# Altium footprint library dcdc_ldo_ref.pcblib: 50 footprints (part 2 of 4)
Each footprint in its own frame and in the unit in brackets; x right, y up, seen from the top. Pads: shape width x height; smd on the part's side, far side on the other; paste and mask are expansions set on the pad; w line width, h text height; cw(c..) or ccw(c..) is an arc to the next point about the centre after c.
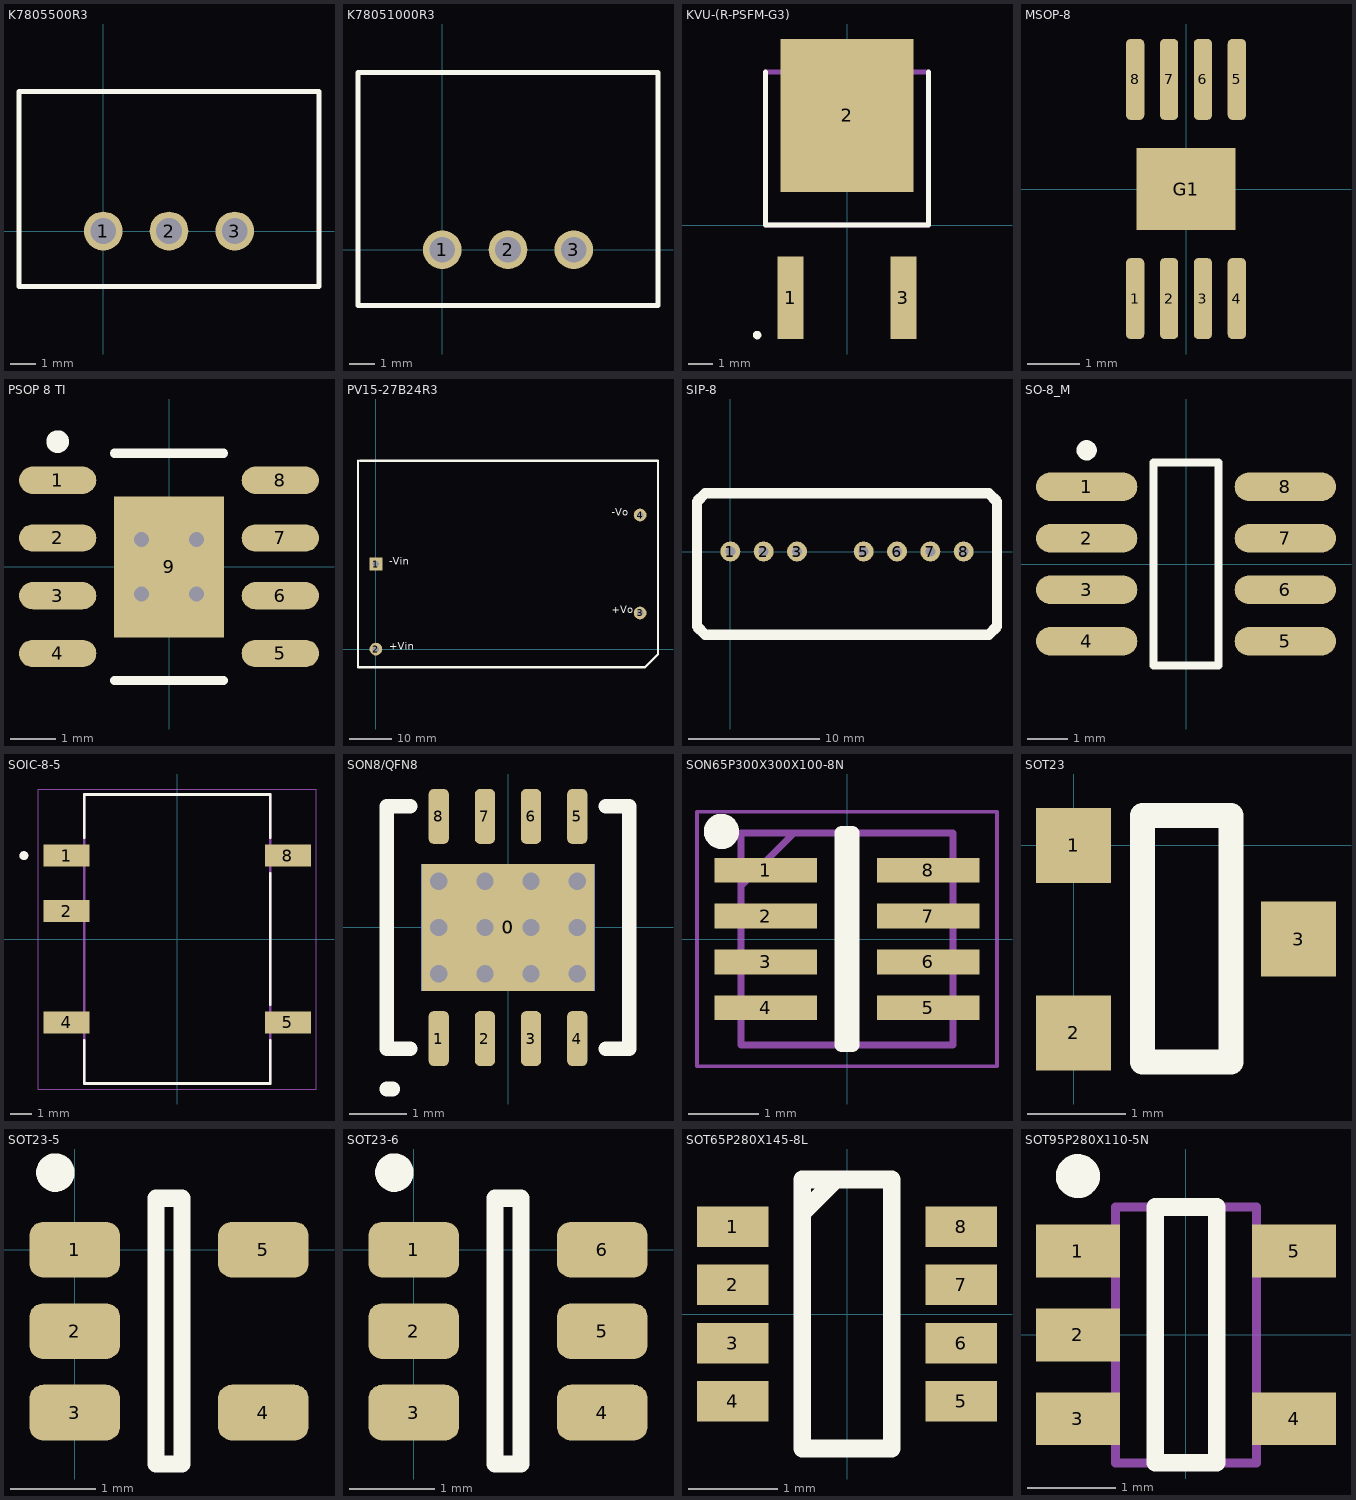
[diagram p1: the footprints below, top view; thin cyan lines are the x and y axes]

## K7805500R3 [mm]
pads (3):
  round 1.5 hole 1: 1(0,0) 2(2.54,0) 3(5.08,0)
Top Overlay:
  lines w0.2: -3.26,-2.15 8.34,-2.15 8.34,5.4 -3.26,5.4 -3.26,-2.15
3D body "K7805-500R3.stp": height 10.51, standoff -5, extent -3.26,-2.15 8.34,5.4

## K78051000R3 [mm]
pads (3):
  round 1.5 hole 1: 1(0,0) 2(2.54,0) 3(5.08,0)
Top Overlay:
  lines w0.2: -3.26,-2.15 -3.26,6.85 8.34,6.85 8.34,-2.15 -3.26,-2.15
3D body "K78xx-1000R3.stp": height 17.5, standoff -4.1, extent -3.2,-2.15 8.3,6.85

## KVU-(R-PSFM-G3) [mm]
pads (3):
  rect 1.07x3.34 smd: 1(-2.29,-2.947) 3(2.29,-2.947)
  rect 5.4x6.2 smd: 2(0,4.453)
Top Overlay:
  circle w0.2: c-3.647,-4.457 r0.072
  lines w0.2: -3.3,6.22 -3.3,0 3.3,0 3.3,6.22
Plata3D:
  lines w0.2: -3.3,0 -3.3,6.22 3.3,6.22 3.3,0 -3.3,0
3D body "UA78M12CKVURG3.stp": height 2.43, standoff 0, extent -3.193,-3.588 3.333,6.518

## MSOP-8 [mm]
pads (9):
  rrect50% 0.35x1.55 smd: 1(-0.975,-2.1) 2(-0.325,-2.1) 3(0.325,-2.1) 4(0.975,-2.1) 5(0.975,2.1) 6(0.325,2.1) 7(-0.325,2.1) 8(-0.975,2.1)
  rect 1.89x1.57 smd: G1(0,0)
3D body "MSOP-8.step": height 1.09, standoff -0.01, extent -1.5,-2.5 1.5,2.5

## PSOP 8 TI [mm]
pads (9):
  oval 1.7x0.6 smd: 1(-2.45,1.905) 2(-2.45,0.635) 3(-2.45,-0.635) 4(-2.45,-1.905) 5(2.45,-1.905) 6(2.45,-0.635) 7(2.45,0.635) 8(2.45,1.905)
  rect 2.41x3.1 smd: 9(0,0)
via -0.6,-0.6 diameter 0.66 hole 0.33
via 0.6,-0.6 diameter 0.66 hole 0.33
via 0.6,0.6 diameter 0.66 hole 0.33
via -0.6,0.6 diameter 0.66 hole 0.33
Top Overlay:
  circle w0.25: c-2.45,2.755 r0.125
  lines w0.2: -1.2,-2.5 1.2,-2.5 ; -1.2,2.5 1.2,2.5
3D body "User Library-SO8-1.step": height 1.7, standoff -0.05, extent -3.1,-2.5 3.1,2.5

## PV15-27B24R3 [mm] "DC-DC thr"
pads (4):
  rect 3x3 hole 1.5: 1(0,20)
  round 3 hole 1.5: 2(0,0) 3(62.09,8.5) 4(62.09,31.5)
Top Overlay:
  lines w0.5: -4.205,44.25 -4.205,-4.25 63.25,-4.25 66.295,-1.205 66.295,44.25 -3.705,44.25
  text "-Vo" at 55.429,30.808 h3
  text "+Vo" at 55.429,7.808 h3
  text "+Vin" at 3.105,-0.762 h3
  text "-Vin" at 3.105,19.238 h3
3D body "PV15-27BxxR3.stp": height 23.6, standoff 0.1, extent -4,-4 66,44

## SIP-8 [mil]
pads (7):
  round 60 hole 30: 1(0,0) 2(100,0) 3(200,0) 5(400,0) 6(500,0) 7(600,0) 8(700,0)
Top Overlay:
  lines w31.5: -100,-225 -75,-250 775,-250 800,-225 800,150 775,175 -75,175 -100,150 -100,0 -100,-225
3D body "User Library-User Library-TRACO TMR rev3.step": height 389.76, standoff -149.61, extent -79.13,-218.12 779.13,152

## SO-8_M [mm] "SOIC, 8-Leads, Body 4.9x3.9mm, Pitch 1.27mm, IPC Low Density"
height 1.75
pads (8):
  oval 2.5x0.7 smd: 1(-2.45,1.905) 2(-2.45,0.635) 3(-2.45,-0.635) 4(-2.45,-1.905) 5(2.45,-1.905) 6(2.45,-0.635) 7(2.45,0.635) 8(2.45,1.905)
Top Overlay:
  circle w0.25: c-2.45,2.805 r0.125
  lines w0.2: -0.8,-2.5 0.8,-2.5 0.8,2.5 -0.8,2.5 -0.8,-2.5
3D body "so-8.step": height 1.88, standoff -0.03, extent -3.169,-2.515 3.169,2.489

## SOIC-8-5 [mm]
pads (5):
  rect 2.1x1 smd: 1(-5.05,3.81) 2(-5.05,1.27) 4(-5.05,-3.81) 5(5.05,-3.81) 8(5.05,3.81)
Top Overlay:
  circle w0.2: c-7,3.81 r0.1
  lines w0.127: -4.25,-4.63 -4.25,-6.6 4.25,-6.6 4.25,-4.63 ; -4.25,4.63 -4.25,6.6 4.25,6.6 4.25,4.63 ; 4.25,-2.99 4.25,2.99
Plata3D:
  circle w0.2: c-7,3.81 r0.1
  lines w0.127: -4.25,-6.6 -4.25,6.6 4.25,6.6 4.25,-6.6 -4.25,-6.6
Board3D:
  lines w0.05: -6.35,-6.85 6.35,-6.85 6.35,6.85 -6.35,6.85 -6.35,-6.85
3D body "step_temp.STEP": height 7.25, standoff 0, extent -5.7,-6.6 5.7,6.6

## SON8/QFN8 [mm] "SON8/QFN8"
pads (10):
  rect 3x2.2 smd mask+0.07: 0(0,0)
  rect 3x2.2 smd far side mask+0.07: 0(0,0)
  rrect50% 0.35x0.95 smd mask+0.07: 1(-1.2,-1.925) 2(-0.4,-1.925) 3(0.4,-1.925) 4(1.2,-1.925) 5(1.2,1.925) 6(0.4,1.925) 7(-0.4,1.925) 8(-1.2,1.925)
via -0.4,0 diameter 0.5 hole 0.3
via 0.4,0 diameter 0.5 hole 0.3
via -1.2,0 diameter 0.5 hole 0.3
via 1.2,0 diameter 0.5 hole 0.3
via 1.2,-0.8 diameter 0.5 hole 0.3
via -1.2,-0.8 diameter 0.5 hole 0.3
via 0.4,-0.8 diameter 0.5 hole 0.3
via -0.4,-0.8 diameter 0.5 hole 0.3
via 1.2,0.8 diameter 0.5 hole 0.3
via -1.2,0.8 diameter 0.5 hole 0.3
via 0.4,0.8 diameter 0.5 hole 0.3
via -0.4,0.8 diameter 0.5 hole 0.3
Top Overlay:
  lines w0.254: -2.1,-2.8 -2,-2.8 ; -1.7,-2.1 -2.1,-2.1 -2.1,2.1 -1.7,2.1 ; 1.7,-2.1 2.1,-2.1 2.1,2.1 1.7,2.1
3D body "User Library-SON8-4x4mm.step": height 0.85, standoff 0, extent -2,-2.05 2,1.95

## SON65P300X300X100-8N [mm]
pads (8):
  rect 1.45x0.35 smd: 1(-1.15,0.975) 2(-1.15,0.325) 3(-1.15,-0.325) 4(-1.15,-0.975) 5(1.15,-0.975) 6(1.15,-0.325) 7(1.15,0.325) 8(1.15,0.975)
Top Overlay:
  circle w0.25: c-1.778,1.524 r0.125
  lines w0.2: -0.075,-1.5 0.075,-1.5 0.075,1.5 -0.075,1.5 -0.075,-1.5
Board3D:
  lines w0.1: -1.5,0.75 -0.75,1.5 ; -1.5,-1.5 1.5,-1.5 1.5,1.5 -1.5,1.5 -1.5,-1.5
Mechanical 20:
  lines w0.05: -2.125,-1.8 2.125,-1.8 2.125,1.8 -2.125,1.8 -2.125,-1.8
3D body "MP9943GQ-P.stp": height 1, standoff 0, extent -1.55,-1.5 1.55,1.5

## SOT23 [mil]
height 118.11
pads (3):
  rect 30x30 smd: 1(0,0) 2(0,-75) 3(90,-37.5)
Top Overlay:
  lines w10: 27.56,-86.61 27.56,11.81 62.99,11.81 62.99,-86.61 27.56,-86.61
3D body "SOT-23.step": height 41.34, standoff -1.97, extent -4,-97 94.42,21.11

## SOT23-5 [mm]
height 3
pads (5):
  rrect50% 1.06x0.65 smd: 1(0,0) 2(0,-0.95) 3(0,-1.9) 4(2.2,-1.9) 5(2.2,0)
Top Overlay:
  circle w0.25: c-0.225,0.9 r0.1
  lines w0.2: 0.95,-2.5 1.25,-2.5 1.25,0.6 0.95,0.6 0.95,-2.5
3D body "sot235.step": height 1, standoff 0, extent -0.07,-2.41 2.27,0.51

## SOT23-6 [mm]
height 3
pads (6):
  rrect50% 1.06x0.65 smd: 1(0,0) 2(0,-0.95) 3(0,-1.9) 4(2.2,-1.9) 5(2.2,-0.95) 6(2.2,0)
Top Overlay:
  circle w0.25: c-0.225,0.9 r0.1
  lines w0.2: 0.95,-2.5 1.25,-2.5 1.25,0.6 0.95,0.6 0.95,-2.5
3D body "TSOP-6.step": height 1, standoff 0, extent -0.25,-2.45 2.45,0.55

## SOT65P280X145-8L [mm] "SOT23, 8-Leads, Body 2.90x2.80mm, Pitch 0.65mm, IPC High Density"
height 1.45
pads (8):
  rect 0.8x0.45 smd: 1(-1.275,0.975) 2(-1.275,0.325) 3(-1.275,-0.325) 4(-1.275,-0.975) 5(1.275,-0.975) 6(1.275,-0.325) 7(1.275,0.325) 8(1.275,0.975)
Top Overlay:
  lines w0.2: -0.5,1.125 -0.125,1.5 ; -0.5,-1.5 -0.5,1.5 0.5,1.5 0.5,-1.5 -0.5,-1.5
3D body "sot23-8.STEP": height 1.2, standoff 0, extent -1.4,-1.47 1.4,1.47

## SOT95P280X110-5N [mm] "SOT23, 5-Leads, Body 2,90x2,80mm, Pitch 0,95mm, IPC Medium Density"
height 1.1
pads (5):
  rect 0.95x0.6 smd: 1(-1.225,0.95) 2(-1.225,0) 3(-1.225,-0.95) 4(1.225,-0.95) 5(1.225,0.95)
Top Overlay:
  circle w0.25: c-1.225,1.8 r0.125
  lines w0.2: -0.35,-1.45 0.35,-1.45 0.35,1.45 -0.35,1.45 -0.35,-1.45
Plata3D:
  lines w0.1: -0.8,-1.45 -0.8,1.45 0.8,1.45 0.8,-1.45 -0.8,-1.45
3D body: height 1.1, standoff 0.1, extent -0.8,-1.45 0.8,1.45